# Altium footprint library PassiveComponents.PcbLib: 111 footprints (part 3 of 7)
Each footprint in its own frame and in the unit in brackets; x right, y up, seen from the top. Pads: shape width x height; smd on the part's side, far side on the other; paste and mask are expansions set on the pad; w line width, h text height; cw(c..) or ccw(c..) is an arc to the next point about the centre after c.
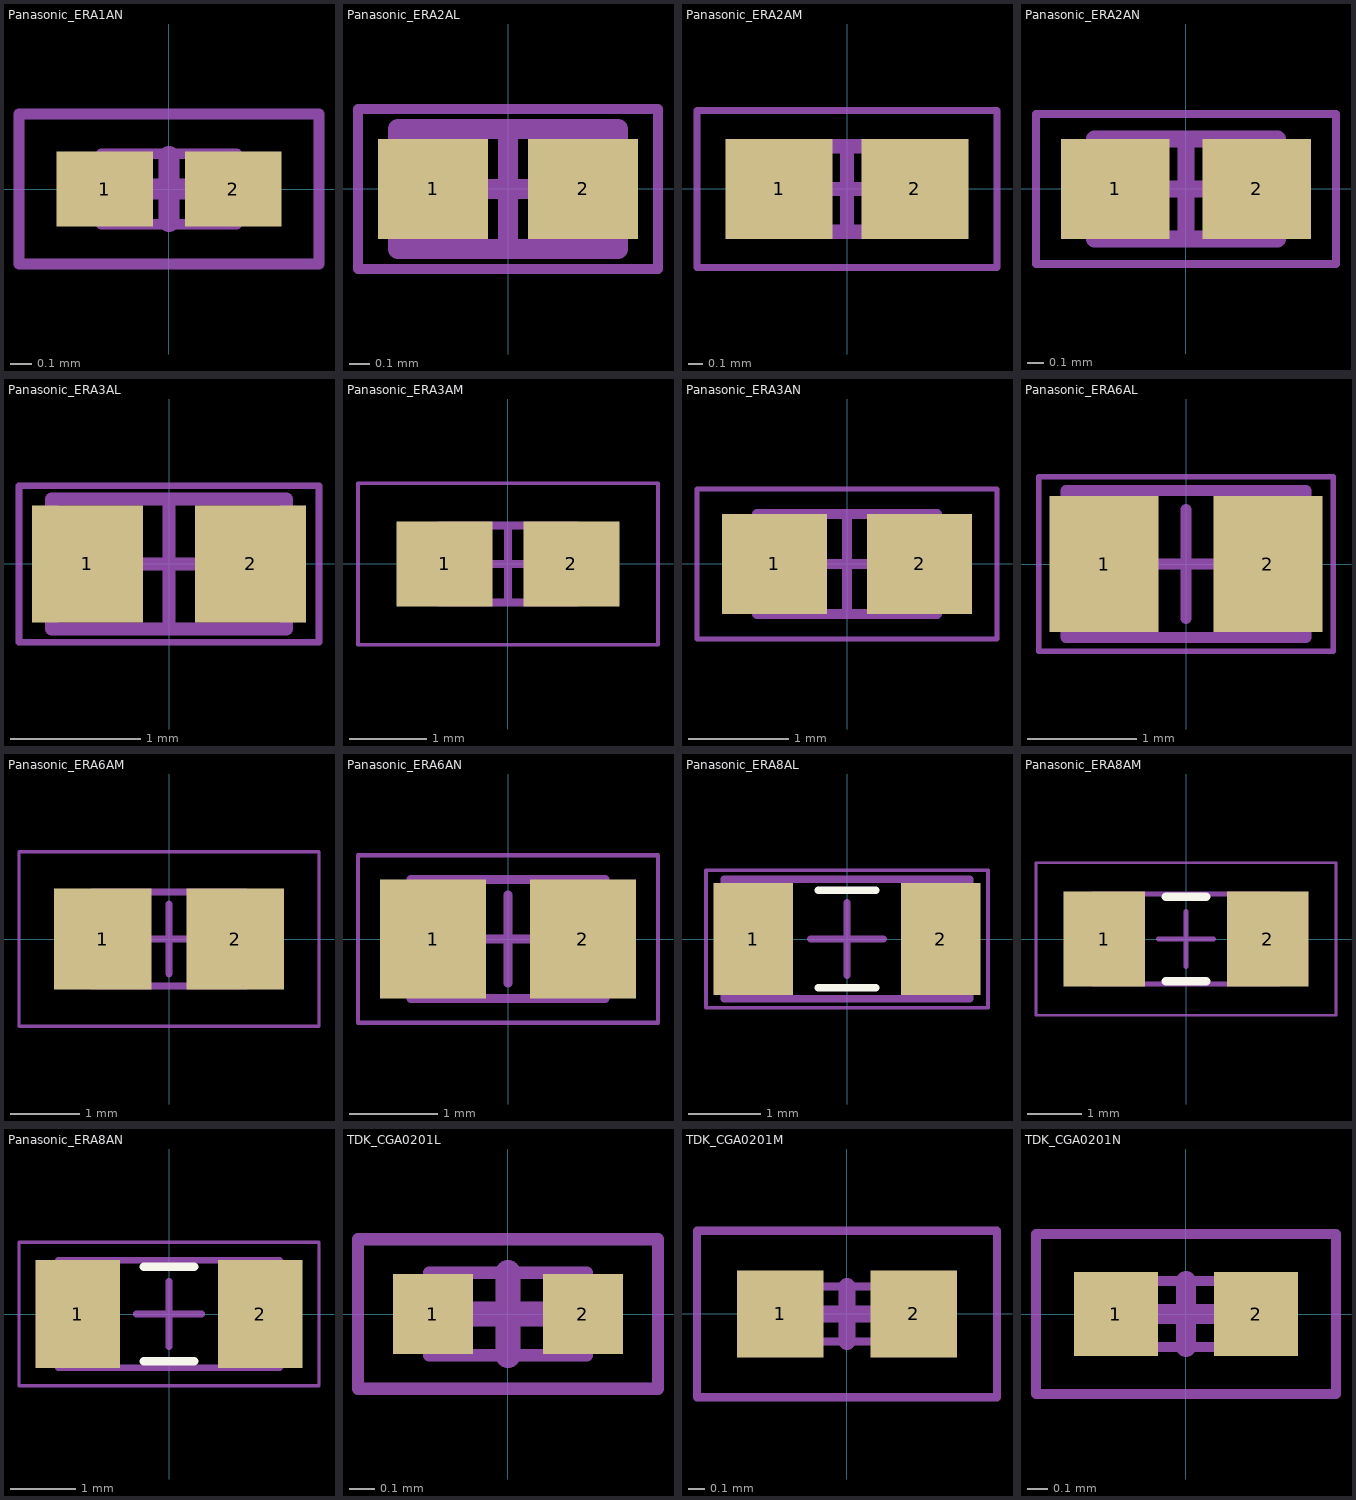
[diagram p2: the footprints below, top view; thin cyan lines are the x and y axes]

## Panasonic_ERA1AN [mm] "Chip Resistor, 2-Leads, Body 0.60x0.30mm, IPC Medium Density"
height 0.26
pads (2):
  rect 0.45x0.35 smd mask+0.03: 1(-0.3,0) 2(0.3,0)
Top Assembly:
  lines w0.05: -0.315,-0.165 0.315,-0.165 0.315,0.165 -0.315,0.165 -0.315,-0.165
  text "'.Designator'" at -0.242,-0.023 h0.1
Top Courtyard:
  lines w0.05: -0.7,-0.35 0.7,-0.35 0.7,0.35 -0.7,0.35 -0.7,-0.35
  lines w0.1: -0.15,0 0.15,0 ; 0,-0.15 0,0.15
3D body "RESC0603X03N.step": height 0.26, standoff 0, extent -0.315,-0.165 0.315,0.165

## Panasonic_ERA2AL [mm] "Chip Resistor, 2-Leads, Body 1.00x0.53mm, IPC High Density"
height 0.4
pads (2):
  rect 0.55x0.5 smd mask+0.05: 1(-0.375,0) 2(0.375,0)
Top Assembly:
  lines w0.1: -0.55,-0.3 0.55,-0.3 0.55,0.3 -0.55,0.3 -0.55,-0.3
  text "'.Designator'" at -0.483,-0.045 h0.2
Top Courtyard:
  lines w0.05: -0.75,-0.4 0.75,-0.4 0.75,0.4 -0.75,0.4 -0.75,-0.4
  lines w0.1: -0.3,0 0.3,0 ; 0,-0.3 0,0.3
3D body "RESC1005X04L.step": height 0.4, standoff 0, extent -0.55,-0.3 0.55,0.3

## Panasonic_ERA2AM [mm] "Chip Resistor, 2-Leads, Body 1.00x0.53mm, IPC Low Density"
height 0.4
pads (2):
  rect 0.75x0.7 smd mask+0.05: 1(-0.475,0) 2(0.475,0)
Top Assembly:
  lines w0.1: -0.55,-0.3 -0.55,0.3 0.55,0.3 0.55,-0.3 -0.55,-0.3
  text "'.Designator'" at -0.483,-0.045 h0.2
Top Courtyard:
  lines w0.05: -1.05,-0.55 -1.05,0.55 1.05,0.55 1.05,-0.55 -1.05,-0.55
  lines w0.1: -0.3,0 0.3,0 ; 0,-0.3 0,0.3
3D body "RESC1005X04M.step": height 0.35, standoff 0, extent -0.55,-0.275 0.55,0.275

## Panasonic_ERA2AN [mm] "Chip Resistor, 2-Leads, Body 1.00x0.53mm, IPC Medium Density"
height 0.4
pads (2):
  rect 0.65x0.6 smd mask+0.05: 1(-0.425,0) 2(0.425,0)
Top Assembly:
  lines w0.1: -0.55,-0.3 0.55,-0.3 0.55,0.3 -0.55,0.3 -0.55,-0.3
  text "'.Designator'" at -0.483,-0.045 h0.2
Top Courtyard:
  lines w0.05: -0.9,-0.45 0.9,-0.45 0.9,0.45 -0.9,0.45 -0.9,-0.45
  lines w0.1: -0.3,0 0.3,0 ; 0,-0.3 0,0.3
3D body "RESC1005X04N.step": height 0.35, standoff 0, extent -0.55,-0.275 0.55,0.275

## Panasonic_ERA3AL [mm] "Chip Resistor, 2-Leads, Body 1.60x0.80mm, IPC High Density"
height 0.55
pads (2):
  rect 0.85x0.9 smd mask+0.05: 1(-0.625,0) 2(0.625,0)
Top Assembly:
  lines w0.1: -0.9,-0.5 -0.9,0.5 0.9,0.5 0.9,-0.5 -0.9,-0.5
  text "'.Designator'" at -0.724,-0.068 h0.3
Top Courtyard:
  lines w0.05: -1.15,-0.6 -1.15,0.6 1.15,0.6 1.15,-0.6 -1.15,-0.6
  lines w0.1: -0.5,0 0.5,0 ; 0,-0.5 0,0.5
3D body "RESC1608X06L.step": height 0.55, standoff 0, extent -0.9,-0.5 0.9,0.5

## Panasonic_ERA3AM [mm] "Chip Resistor, 2-Leads, Body 1.60x0.80mm, IPC Low Density"
height 0.55
pads (2):
  rect 1.25x1.1 smd mask+0.05: 1(-0.825,0) 2(0.825,0)
Top Assembly:
  lines w0.1: -0.9,-0.5 -0.9,0.5 0.9,0.5 0.9,-0.5 -0.9,-0.5
  text "'.Designator'" at -0.724,-0.068 h0.3
Top Courtyard:
  lines w0.05: -1.95,-1.05 -1.95,1.05 1.95,1.05 1.95,-1.05 -1.95,-1.05
  lines w0.1: -0.5,0 0.5,0 ; 0,-0.5 0,0.5
3D body "RESC1608X06M.step": height 0.55, standoff 0, extent -0.85,-0.45 0.85,0.45

## Panasonic_ERA3AN [mm] "Chip Resistor, 2-Leads, Body 1.60x0.80mm, IPC Medium Density"
height 0.55
pads (2):
  rect 1.05x1 smd mask+0.05: 1(-0.725,0) 2(0.725,0)
Top Assembly:
  lines w0.1: -0.9,-0.5 0.9,-0.5 0.9,0.5 -0.9,0.5 -0.9,-0.5
  text "'.Designator'" at -0.724,-0.068 h0.3
Top Courtyard:
  lines w0.05: -1.5,-0.75 1.5,-0.75 1.5,0.75 -1.5,0.75 -1.5,-0.75
  lines w0.1: -0.5,0 0.5,0 ; 0,-0.5 0,0.5
3D body "RESC1608X06N.step": height 0.55, standoff 0, extent -0.85,-0.45 0.85,0.45

## Panasonic_ERA6AL [mm] "Chip Resistor, 2-Leads, Body 2.00x1.25mm, IPC High Density"
height 0.6
pads (2):
  rect 1x1.25 smd mask+0.05: 1(-0.75,0) 2(0.75,0)
Top Assembly:
  lines w0.1: -1.1,-0.675 1.1,-0.675 1.1,0.675 -1.1,0.675 -1.1,-0.675
  text "'.Designator'" at -0.963,-0.09 h0.4
Top Courtyard:
  lines w0.05: -1.35,-0.8 1.35,-0.8 1.35,0.8 -1.35,0.8 -1.35,-0.8
  lines w0.1: -0.5,0 0.5,0 ; 0,-0.5 0,0.5
3D body "RESC2012X06L.step": height 0.6, standoff 0, extent -1.05,-0.675 1.05,0.675

## Panasonic_ERA6AM [mm] "Chip Resistor, 2-Leads, Body 2.00x1.25mm, IPC Low Density"
height 0.6
pads (2):
  rect 1.4x1.45 smd mask+0.05: 1(-0.95,0) 2(0.95,0)
Top Assembly:
  lines w0.1: -1.1,-0.675 1.1,-0.675 1.1,0.675 -1.1,0.675 -1.1,-0.675
  text "'.Designator'" at -0.963,-0.09 h0.4
Top Courtyard:
  lines w0.05: -2.15,-1.25 2.15,-1.25 2.15,1.25 -2.15,1.25 -2.15,-1.25
  lines w0.1: -0.5,0 0.5,0 ; 0,-0.5 0,0.5
3D body "RESC2012X06M.step": height 0.6, standoff 0, extent -1.1,-0.675 1.1,0.675

## Panasonic_ERA6AN [mm] "Chip Resistor, 2-Leads, Body 2.00x1.25mm, IPC Medium Density"
height 0.6
pads (2):
  rect 1.2x1.35 smd mask+0.05: 1(-0.85,0) 2(0.85,0)
Top Assembly:
  lines w0.1: -1.1,-0.675 -1.1,0.675 1.1,0.675 1.1,-0.675 -1.1,-0.675
  text "'.Designator'" at -0.963,-0.09 h0.4
Top Courtyard:
  lines w0.05: -1.7,-0.95 -1.7,0.95 1.7,0.95 1.7,-0.95 -1.7,-0.95
  lines w0.1: -0.5,0 0.5,0 ; 0,-0.5 0,0.5
3D body "RESC2012X06N.step": height 0.6, standoff 0, extent -1.05,-0.675 1.05,0.675

## Panasonic_ERA8AL [mm] "Chip Resistor, 2-Leads, Body 3.20x1.55mm, IPC High Density"
height 0.7
pads (2):
  rect 1.1x1.55 smd mask+0.05: 1(-1.3,0) 2(1.3,0)
Top Overlay:
  lines w0.102: -0.399,-0.675 0.399,-0.675 ; -0.399,0.675 0.399,0.675
Top Assembly:
  lines w0.1: -1.7,-0.825 1.7,-0.825 1.7,0.825 -1.7,0.825 -1.7,-0.825
  text "'.Designator'" at -1.209,-0.113 h0.5
Top Courtyard:
  lines w0.05: -1.95,-0.95 1.95,-0.95 1.95,0.95 -1.95,0.95 -1.95,-0.95
  lines w0.1: -0.5,0 0.5,0 ; 0,-0.5 0,0.5
3D body "RESC3215X07L.step": height 0.7, standoff 0, extent -1.7,-0.825 1.7,0.825

## Panasonic_ERA8AM [mm] "Chip Resistor, 2-Leads, Body 3.20x1.55mm, IPC Low Density"
height 0.7
pads (2):
  rect 1.5x1.75 smd mask+0.05: 1(-1.5,0) 2(1.5,0)
Top Overlay:
  lines w0.152: -0.374,-0.775 0.374,-0.775 ; -0.374,0.775 0.374,0.775
Top Assembly:
  lines w0.1: -1.7,-0.825 -1.7,0.825 1.7,0.825 1.7,-0.825 -1.7,-0.825
  text "'.Designator'" at -1.209,-0.113 h0.5
Top Courtyard:
  lines w0.05: -2.75,-1.4 -2.75,1.4 2.75,1.4 2.75,-1.4 -2.75,-1.4
  lines w0.1: -0.5,0 0.5,0 ; 0,-0.5 0,0.5
3D body "RESC3215X07M.step": height 0.7, standoff 0, extent -1.7,-0.825 1.7,0.825

## Panasonic_ERA8AN [mm] "Chip Resistor, 2-Leads, Body 3.20x1.55mm, IPC Medium Density"
height 0.7
pads (2):
  rect 1.3x1.65 smd mask+0.05: 1(-1.4,0) 2(1.4,0)
Top Overlay:
  lines w0.127: -0.387,-0.725 0.387,-0.725 ; -0.387,0.725 0.387,0.725
Top Assembly:
  lines w0.1: -1.7,-0.825 1.7,-0.825 1.7,0.825 -1.7,0.825 -1.7,-0.825
  text "'.Designator'" at -1.209,-0.113 h0.5
Top Courtyard:
  lines w0.05: -2.3,-1.1 2.3,-1.1 2.3,1.1 -2.3,1.1 -2.3,-1.1
  lines w0.1: -0.5,0 0.5,0 ; 0,-0.5 0,0.5
3D body "RESC3215X07N.step": height 0.7, standoff 0, extent -1.7,-0.825 1.7,0.825

## TDK_CGA0201L [mm] "Chip Capacitor, 2-Leads, Body 0.60x0.30mm, IPC High Density"
height 0.33
pads (2):
  rect 0.32x0.32 smd mask+0.05: 1(-0.3,0) 2(0.3,0)
Top Assembly:
  lines w0.05: -0.315,-0.165 -0.315,0.165 0.315,0.165 0.315,-0.165 -0.315,-0.165
  text "'.Designator'" at -0.242,-0.023 h0.1
Top Courtyard:
  lines w0.05: -0.6,-0.3 -0.6,0.3 0.6,0.3 0.6,-0.3 -0.6,-0.3
  lines w0.1: -0.165,0 0.165,0 ; 0,-0.165 0,0.165
3D body "CAPC0603X03L.step": height 0.33, standoff 0, extent -0.315,-0.165 0.315,0.165

## TDK_CGA0201M [mm] "Chip Capacitor, 2-Leads, Body 0.60x0.30mm, IPC Low Density"
height 0.33
pads (2):
  rect 0.52x0.52 smd mask+0.05: 1(-0.4,0) 2(0.4,0)
Top Assembly:
  lines w0.05: -0.315,-0.165 0.315,-0.165 0.315,0.165 -0.315,0.165 -0.315,-0.165
  text "'.Designator'" at -0.242,-0.023 h0.1
Top Courtyard:
  lines w0.05: -0.9,-0.5 0.9,-0.5 0.9,0.5 -0.9,0.5 -0.9,-0.5
  lines w0.1: -0.165,0 0.165,0 ; 0,-0.165 0,0.165
3D body "CAPC0603X03M.step": height 0.33, standoff 0, extent -0.315,-0.165 0.315,0.165

## TDK_CGA0201N [mm] "Chip Capacitor, 2-Leads, Body 0.60x0.30mm, IPC Medium Density"
height 0.33
pads (2):
  rect 0.42x0.42 smd mask+0.05: 1(-0.35,0) 2(0.35,0)
Top Assembly:
  lines w0.05: -0.315,-0.165 -0.315,0.165 0.315,0.165 0.315,-0.165 -0.315,-0.165
  text "'.Designator'" at -0.242,-0.023 h0.1
Top Courtyard:
  lines w0.05: -0.75,-0.4 -0.75,0.4 0.75,0.4 0.75,-0.4 -0.75,-0.4
  lines w0.1: -0.165,0 0.165,0 ; 0,-0.165 0,0.165
3D body "CAPC0603X03N.step": height 0.33, standoff 0, extent -0.315,-0.165 0.315,0.165